# Altium footprint library ADP_Misc.PcbLib: 46 footprints (part 1 of 3)
Each footprint in its own frame and in the unit in brackets; x right, y up, seen from the top. Pads: shape width x height; smd on the part's side, far side on the other; paste and mask are expansions set on the pad; w line width, h text height; cw(c..) or ccw(c..) is an arc to the next point about the centre after c.
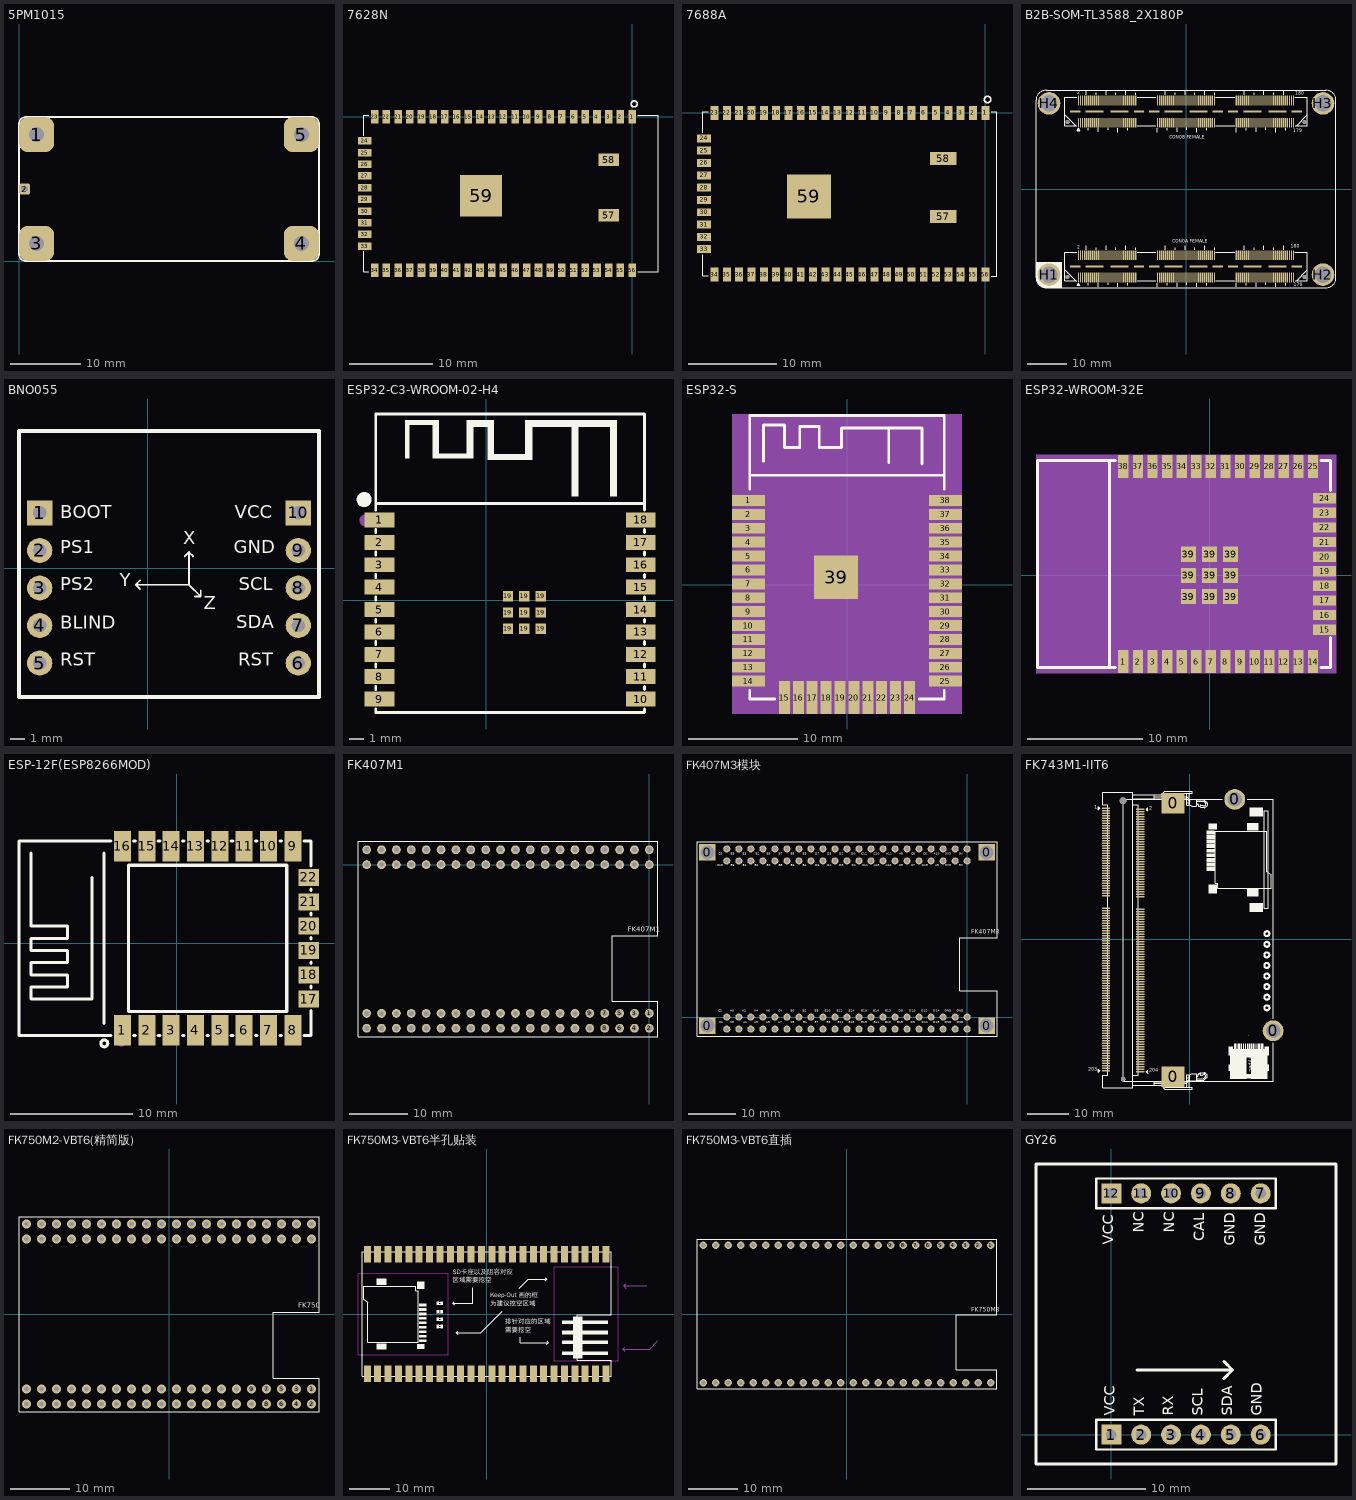
[diagram p0: the footprints below, top view; thin cyan lines are the x and y axes]

## 5PM1015 [mm] "5A输出电源模块"
pads (5):
  rrect50% 5x5 hole 2.1: 1(2.5,18) 3(2.5,2.5) 4(40.2,2.5) 5(40.2,18)
  rrect50% 1.6x1.6 hole 1: 2(0.8,10.25)
Top Overlay:
  lines w0.254: 0,1 ccw(c1,1) 1,0 41.7,0 ccw(c41.7,1) 42.7,1 42.7,19.5 ccw(c41.7,19.5) 41.7,20.5 1,20.5 ccw(c1,19.5) 0,19.5 0,1

## 7628N [mm]
height 2.5
pads (59):
  rect 0.9x1.6 smd: 1(0,0) 2(-1.4,0) 3(-2.8,0) 4(-4.2,0) 5(-5.6,0) 6(-7,0) 7(-8.4,0) 8(-9.8,0) 9(-11.2,0) 10(-12.6,0) 11(-14,0) 12(-15.4,0) 13(-16.8,0) 14(-18.2,0) 15(-19.6,0) 16(-21,0) 17(-22.4,0) 18(-23.8,0) 19(-25.2,0) 20(-26.6,0) 21(-28,0) 22(-29.4,0) 23(-30.8,0) 34(-30.8,-18.4) 35(-29.4,-18.4) 36(-28,-18.4) 37(-26.6,-18.4) 38(-25.2,-18.4) 39(-23.8,-18.4) 40(-22.4,-18.4) 41(-21,-18.4) 42(-19.6,-18.4) 43(-18.2,-18.4) 44(-16.8,-18.4) 45(-15.4,-18.4) 46(-14,-18.4) 47(-12.6,-18.4) 48(-11.2,-18.4) 49(-9.8,-18.4) 50(-8.4,-18.4) 51(-7,-18.4) 52(-5.6,-18.4) 53(-4.2,-18.4) 54(-2.8,-18.4) 55(-1.4,-18.4) 56(0,-18.4)
  rect 1.6x0.9 smd: 24(-32,-2.9) 25(-32,-4.3) 26(-32,-5.7) 27(-32,-7.1) 28(-32,-8.5) 29(-32,-9.9) 30(-32,-11.3) 31(-32,-12.7) 32(-32,-14.1) 33(-32,-15.5)
  rect 2.5x1.5 smd: 57(-2.8,-11.773) 58(-2.8,-5.173)
  rect 5x5 smd: 59(-18.066,-9.473)
Top Layer:
  lines w0.15: -30.8,-18.4 -30.8,-18.4
Top Overlay:
  circle w0.15: c0.254,1.524 r0.359
  lines w0.1: -32.131,-16.129 -32.131,-18.542 -31.496,-18.542 ; -32.131,-2.271 -32.131,0.142 -31.496,0.142 ; 0.696,-18.557 3.1,-18.557 3.1,0.142 0.696,0.142

## 7688A [mm]
height 2.5
pads (59):
  rect 0.9x1.6 smd: 1(0,0) 2(-1.4,0) 3(-2.8,0) 4(-4.2,0) 5(-5.6,0) 6(-7,0) 7(-8.4,0) 8(-9.8,0) 9(-11.2,0) 10(-12.6,0) 11(-14,0) 12(-15.4,0) 13(-16.8,0) 14(-18.2,0) 15(-19.6,0) 16(-21,0) 17(-22.4,0) 18(-23.8,0) 19(-25.2,0) 20(-26.6,0) 21(-28,0) 22(-29.4,0) 23(-30.8,0) 34(-30.8,-18.4) 35(-29.4,-18.4) 36(-28,-18.4) 37(-26.6,-18.4) 38(-25.2,-18.4) 39(-23.8,-18.4) 40(-22.4,-18.4) 41(-21,-18.4) 42(-19.6,-18.4) 43(-18.2,-18.4) 44(-16.8,-18.4) 45(-15.4,-18.4) 46(-14,-18.4) 47(-12.6,-18.4) 48(-11.2,-18.4) 49(-9.8,-18.4) 50(-8.4,-18.4) 51(-7,-18.4) 52(-5.6,-18.4) 53(-4.2,-18.4) 54(-2.8,-18.4) 55(-1.4,-18.4) 56(0,-18.4)
  rect 1.6x0.9 smd: 24(-32,-2.9) 25(-32,-4.3) 26(-32,-5.7) 27(-32,-7.1) 28(-32,-8.5) 29(-32,-9.9) 30(-32,-11.3) 31(-32,-12.7) 32(-32,-14.1) 33(-32,-15.5)
  rect 3x1.5 smd: 57(-4.8,-11.8) 58(-4.8,-5.2)
  rect 5x5 smd: 59(-20.066,-9.5)
Top Overlay:
  circle w0.15: c0.254,1.524 r0.359
  lines w0.1: -32.131,-16.129 -32.131,-18.542 -31.496,-18.542 ; -32.131,-2.271 -32.131,0.142 -31.496,0.142 ; 0.696,-18.557 1.331,-18.557 1.331,0.142 0.696,0.142

## B2B-SOM-TL3588_2X180P [mil] "B2B-SOM-TL3588_2X180P"
pads (392):
  rect 12x95 smd: A1(-1073.82,-881.76) A2(-1073.82,-661.29) A3(-1054.13,-881.76) A4(-1054.13,-661.29) A5(-1034.45,-881.76) A6(-1034.45,-661.29) A7(-1014.76,-881.76) A8(-1014.76,-661.29) A9(-995.08,-881.76) A10(-995.08,-661.29) A11(-975.4,-881.76) A12(-975.4,-661.29) A13(-955.71,-881.76) A14(-955.71,-661.29) A15(-936.03,-881.76) A16(-936.03,-661.29) A17(-916.34,-881.76) A18(-916.34,-661.29) A19(-896.66,-881.76) A20(-896.66,-661.29) A21(-876.97,-881.76) A22(-876.97,-661.29) A23(-857.29,-881.76) A24(-857.29,-661.29) A25(-837.6,-881.76) A26(-837.6,-661.29) A27(-817.92,-881.76) A28(-817.92,-661.29) A29(-798.23,-881.76) A30(-798.23,-661.29) A31(-778.55,-881.76) A32(-778.55,-661.29) A33(-758.86,-881.76) A34(-758.86,-661.29) A35(-739.18,-881.76) A36(-739.18,-661.29) A37(-719.49,-881.76) A38(-719.49,-661.29) A39(-699.81,-881.76) A40(-699.81,-661.29) A41(-680.12,-881.76) A42(-680.12,-661.29) A43(-660.44,-881.76) A44(-660.44,-661.29) A45(-640.75,-881.76) A46(-640.75,-661.29) A47(-621.07,-881.76) A48(-621.07,-661.29) A49(-601.38,-881.76) A50(-601.38,-661.29) A51(-581.7,-881.76) A52(-581.7,-661.29) A53(-562,-881.76) A54(-562,-661.29) A55(-542.33,-881.76) A56(-542.33,-661.29) A57(-522.63,-881.76) A58(-522.63,-661.29) A59(-502.96,-881.76) A60(-502.96,-661.29) A61(-286.42,-881.76) A62(-286.42,-661.29) A63(-266.74,-881.76) A64(-266.74,-661.29) A65(-247.05,-881.76) A66(-247.05,-661.29) A67(-227.37,-881.76) A68(-227.37,-661.29) A69(-207.68,-881.76) A70(-207.68,-661.29) A71(-188,-881.76) A72(-188,-661.29) A73(-168.31,-881.76) A74(-168.31,-661.29) A75(-148.63,-881.76) A76(-148.63,-661.29) A77(-128.94,-881.76) A78(-128.94,-661.29) A79(-109.26,-881.76) A80(-109.26,-661.29) A81(-89.57,-881.76) A82(-89.57,-661.29) A83(-69.89,-881.76) A84(-69.89,-661.29) A85(-50.2,-881.76) A86(-50.2,-661.29) A87(-30.52,-881.76) A88(-30.52,-661.29) A89(-10.83,-881.76) A90(-10.83,-661.29) A91(8.85,-881.76) A92(8.85,-661.29) A93(28.54,-881.76) A94(28.54,-661.29) A95(48.22,-881.76) A96(48.22,-661.29) A97(67.91,-881.76) A98(67.91,-661.29) A99(87.59,-881.76) A100(87.59,-661.29) A101(107.28,-881.76) A102(107.28,-661.29) A103(126.96,-881.76) A104(126.96,-661.29) A105(146.65,-881.76) A106(146.65,-661.29) A107(166.33,-881.76) A108(166.33,-661.29) A109(186.02,-881.76) A110(186.02,-661.29) A111(205.7,-881.76) A112(205.7,-661.29) A113(225.39,-881.76) A114(225.39,-661.29) A115(245.07,-881.76) A116(245.07,-661.29) A117(264.76,-881.76) A118(264.76,-661.29) A119(284.44,-881.76) A120(284.44,-661.29) A121(500.98,-881.76) A122(500.98,-661.29) A123(520.67,-881.76) A124(520.67,-661.29) A125(540.35,-881.76) A126(540.35,-661.29) A127(560.04,-881.76) A128(560.04,-661.29) A129(579.72,-881.76) A130(579.72,-661.29) A131(599.41,-881.76) A132(599.41,-661.29) A133(619.09,-881.76) A134(619.09,-661.29) A135(638.78,-881.76) A136(638.78,-661.29) A137(658.46,-881.76) A138(658.46,-661.29) A139(678.15,-881.76) A140(678.15,-661.29) A141(697.83,-881.76) A142(697.83,-661.29) A143(717.52,-881.76) A144(717.52,-661.29) A145(737.2,-881.76) A146(737.2,-661.29) A147(756.89,-881.76) A148(756.89,-661.29) A149(776.57,-881.76) A150(776.57,-661.29) A151(796.26,-881.76) A152(796.26,-661.29) A153(815.94,-881.76) A154(815.94,-661.29) A155(835.63,-881.76) A156(835.63,-661.29) A157(855.31,-881.76) A158(855.31,-661.29) A159(875,-881.76) A160(875,-661.29) A161(894.68,-881.76) A162(894.68,-661.29) A163(914.37,-881.76) A164(914.37,-661.29) A165(934.05,-881.76) A166(934.05,-661.29) A167(953.74,-881.76) A168(953.74,-661.29) A169(973.42,-881.76) A170(973.42,-661.29) A171(993.11,-881.76) A172(993.11,-661.29) A173(1012.79,-881.76) A174(1012.79,-661.29) A175(1032.48,-881.76) A176(1032.48,-661.29) A177(1052.16,-881.76) A178(1052.16,-661.29) A179(1071.85,-881.76) A180(1071.85,-661.29) B1(-1073.82,663.26) B2(-1073.82,883.73) B3(-1054.13,663.26) B4(-1054.13,883.73) B5(-1034.45,663.26) B6(-1034.45,883.73) B7(-1014.76,663.26) B8(-1014.76,883.73) B9(-995.08,663.26) B10(-995.08,883.73) B11(-975.4,663.26) B12(-975.4,883.73) B13(-955.71,663.26) B14(-955.71,883.73) B15(-936.03,663.26) B16(-936.03,883.73) B17(-916.34,663.26) B18(-916.34,883.73) B19(-896.66,663.26) B20(-896.66,883.73) B21(-876.97,663.26) B22(-876.97,883.73) B23(-857.29,663.26) B24(-857.29,883.73) B25(-837.6,663.26) B26(-837.6,883.73) B27(-817.92,663.26) B28(-817.92,883.73) B29(-798.23,663.26) B30(-798.23,883.73) B31(-778.55,663.26) B32(-778.55,883.73) B33(-758.86,663.26) B34(-758.86,883.73) B35(-739.18,663.26) B36(-739.18,883.73) B37(-719.49,663.26) B38(-719.49,883.73) B39(-699.81,663.26) B40(-699.81,883.73) B41(-680.12,663.26) B42(-680.12,883.73) B43(-660.44,663.26) B44(-660.44,883.73) B45(-640.75,663.26) B46(-640.75,883.73) B47(-621.07,663.26) B48(-621.07,883.73) B49(-601.38,663.26) B50(-601.38,883.73) B51(-581.7,663.26) B52(-581.7,883.73) B53(-562,663.26) B54(-562,883.73) B55(-542.33,663.26) B56(-542.33,883.73) B57(-522.63,663.26) B58(-522.63,883.73) B59(-502.96,663.26) B60(-502.96,883.73) B61(-286.42,663.26) B62(-286.42,883.73) B63(-266.74,663.26) B64(-266.74,883.73) B65(-247.05,663.26) B66(-247.05,883.73) B67(-227.37,663.26) B68(-227.37,883.73) B69(-207.68,663.26) B70(-207.68,883.73) B71(-188,663.26) B72(-188,883.73) B73(-168.31,663.26) B74(-168.31,883.73) B75(-148.63,663.26) B76(-148.63,883.73) B77(-128.94,663.26) B78(-128.94,883.73) B79(-109.26,663.26) B80(-109.26,883.73) B81(-89.57,663.26) B82(-89.57,883.73) B83(-69.89,663.26) B84(-69.89,883.73) B85(-50.2,663.26) B86(-50.2,883.73) B87(-30.52,663.26) B88(-30.52,883.73) B89(-10.83,663.26) B90(-10.83,883.73) B91(8.85,663.26) B92(8.85,883.73) B93(28.54,663.26) B94(28.54,883.73) B95(48.22,663.26) B96(48.22,883.73) B97(67.91,663.26) B98(67.91,883.73) B99(87.59,663.26) B100(87.59,883.73) B101(107.28,663.26) B102(107.28,883.73) B103(126.96,663.26) B104(126.96,883.73) B105(146.65,663.26) B106(146.65,883.73) B107(166.33,663.26) B108(166.33,883.73) B109(186.02,663.26) B110(186.02,883.73) B111(205.7,663.26) B112(205.7,883.73) B113(225.39,663.26) B114(225.39,883.73) B115(245.07,663.26) B116(245.07,883.73) B117(264.76,663.26) B118(264.76,883.73) B119(284.44,663.26) B120(284.44,883.73) B121(500.98,663.26) B122(500.98,883.73) B123(520.67,663.26) B124(520.67,883.73) B125(540.35,663.26) B126(540.35,883.73) B127(560.04,663.26) B128(560.04,883.73) B129(579.72,663.26) B130(579.72,883.73) B131(599.41,663.26) B132(599.41,883.73) B133(619.09,663.26) B134(619.09,883.73) B135(638.78,663.26) B136(638.78,883.73) B137(658.46,663.26) B138(658.46,883.73) B139(678.15,663.26) B140(678.15,883.73) B141(697.83,663.26) B142(697.83,883.73) B143(717.52,663.26) B144(717.52,883.73) B145(737.2,663.26) B146(737.2,883.73) B147(756.89,663.26) B148(756.89,883.73) B149(776.57,663.26) B150(776.57,883.73) B151(796.26,663.26) B152(796.26,883.73) B153(815.94,663.26) B154(815.94,883.73) B155(835.63,663.26) B156(835.63,883.73) B157(855.31,663.26) B158(855.31,883.73) B159(875,663.26) B160(875,883.73) B161(894.68,663.26) B162(894.68,883.73) B163(914.37,663.26) B164(914.37,883.73) B165(934.05,663.26) B166(934.05,883.73) B167(953.74,663.26) B168(953.74,883.73) B169(973.42,663.26) B170(973.42,883.73) B171(993.11,663.26) B172(993.11,883.73) B173(1012.79,663.26) B174(1012.79,883.73) B175(1032.48,663.26) B176(1032.48,883.73) B177(1052.16,663.26) B178(1052.16,883.73) B179(1071.85,663.26) B180(1071.85,883.73)
  rect 102x20 smd: A181(-1105.91,-771.53) A184(-470.87,-771.53) A185(-318.5,-771.53) A188(316.54,-771.53) A189(468.89,-771.53) A192(1103.93,-771.53) B181(-1105.91,773.5) B184(-470.87,773.5) B185(-318.5,773.5) B188(316.54,773.5) B189(468.89,773.5) B192(1103.93,773.5)
  rect 177x20 smd: A182(-913.39,-771.53) A183(-663.39,-771.53) A186(-125.98,-771.53) A187(124.02,-771.53) A190(661.41,-771.53) A191(911.41,-771.53) B182(-913.39,773.5) B183(-663.39,773.5) B186(-125.98,773.5) B187(124.02,773.5) B190(661.41,773.5) B191(911.41,773.5)
  round 225.2 / inner round 185 / far side round 225.2 hole 166: H1(-1367.13,-853.38) H2(1365.16,-853.38) H3(1365.16,855.28) H4(-1367.13,855.28)
  round 40 hole 40 unplated: ""(-1184.65,-876.64) ""(-1184.65,668.37) ""(1182.67,-876.64) ""(1182.67,668.37)
Top Overlay:
  drawing of 120 lines, arcs and shapes, not listed
  text "180" at 1045.56,-587.29 h31
  text "179" at 1075.56,-969.29 h31
  text "CON0A FEMALE" at -140.44,-536.29 h31
  text "2" at -1083.44,-593.29 h31
  text "180" at 1088.56,938.71 h31
  text "179" at 1066.56,564.71 h31
  text "CON0B FEMALE" at -168.44,501.71 h31
  text "2" at -1087.44,946.71 h31
Top Paste:
  drawing of 16 lines, arcs and shapes, not listed

## BNO055 [mm] "DFROBOT-BNO055模块"
pads (10):
  rect 1.7x1.7 hole 0.9: 1(-7.3,3.76) 10(10.2,3.76)
  round 1.7 hole 0.9: 2(-7.3,1.22) 3(-7.3,-1.32) 4(-7.3,-3.86) 5(-7.3,-6.4) 6(10.2,-6.4) 7(10.2,-3.86) 8(10.2,-1.32) 9(10.2,1.22)
Top Overlay:
  lines w0.127: -0.517,-1.383 -0.8,-1.1 ; -0.517,-0.817 -0.8,-1.1 ; 2.517,0.817 2.8,1.1 ; 3.083,0.817 2.8,1.1 ; 3.2,-1.9 3.6,-1.9 ; 3.6,-1.5 3.6,-1.9 ; -0.8,-1.1 2.8,-1.1 ; 2.8,-1.1 2.8,1.1 ; 2.8,-1.1 3.6,-1.9 ; 3.6,-1.9 3.6,-1.9
  lines w0.254: -8.7,-8.7 -8.7,9.3 11.6,9.3 11.6,-8.7 -8.7,-8.7
  text "PS1" at -5.9,0.716 h1.52
  text "RST" at -5.9,-6.884 h1.52
  text "PS2" at -5.9,-1.767 h1.52
  text "BLIND" at -5.9,-4.383 h1.52
  text "BOOT" at -5.9,3.076 h1.52
  text "GND" at 5.843,0.716 h1.52
  text "SCL" at 6.185,-1.767 h1.52
  text "RST" at 6.136,-6.884 h1.52
  text "VCC" at 5.908,3.076 h1.52
  text "SDA" at 5.985,-4.367 h1.52
  text "Y" at -1.899,-1.5 h1.52
  text "X" at 2.399,1.317 h1.52
  text "Z" at 3.799,-3.083 h1.52
3D body "HDR2.54-1P_M.STEP": height 8.5, standoff -3, extent -8.57,-7.67 -6.03,-5.13
3D body "HDR2.54-1P_M.STEP": height 8.5, standoff -3, extent -8.57,-5.13 -6.03,-2.59
3D body "HDR2.54-1P_M.STEP": height 8.5, standoff -3, extent -8.57,-0.05 -6.03,2.49
3D body "HDR2.54-1P_M.STEP": height 8.5, standoff -3, extent -8.57,2.49 -6.03,5.03
3D body "HDR2.54-1P_M.STEP": height 8.5, standoff -3, extent -8.57,-2.59 -6.03,-0.05
3D body "HDR2.54-1P_M.STEP": height 8.5, standoff -3, extent 8.93,-7.67 11.47,-5.13
3D body "HDR2.54-1P_M.STEP": height 8.5, standoff -3, extent 8.93,-5.13 11.47,-2.59
3D body "HDR2.54-1P_M.STEP": height 8.5, standoff -3, extent 8.93,-0.05 11.47,2.49
3D body "HDR2.54-1P_M.STEP": height 8.5, standoff -3, extent 8.93,2.49 11.47,5.03
3D body "HDR2.54-1P_M.STEP": height 8.5, standoff -3, extent 8.93,-2.59 11.47,-0.05

## ESP32-C3-WROOM-02-H4 [mm]
pads (27):
  rect 2x1 smd: 1(-7.149,5.38) 2(-7.149,3.88) 3(-7.149,2.38) 4(-7.149,0.88) 5(-7.149,-0.62) 6(-7.149,-2.12) 7(-7.149,-3.62) 8(-7.149,-5.12) 9(-7.149,-6.62) 10(10.351,-6.62) 11(10.351,-5.12) 12(10.351,-3.62) 13(10.351,-2.12) 14(10.351,-0.62) 15(10.351,0.88) 16(10.351,2.38) 17(10.351,3.88) 18(10.351,5.38)
  rect 0.7x0.7 smd: 19(1.461,-1.92) 19(1.461,-0.82) 19(1.461,0.28) 19(2.561,-1.92) 19(2.561,-0.82) 19(2.561,0.28) 19(3.661,-1.92) 19(3.661,-0.82) 19(3.661,0.28)
Top Overlay:
  circle w0.5: c-8.178,6.746 r0.25
  region: -4.969,12.065 -3.191,12.065 -3.191,9.815 -1.286,9.815 -1.286,12.065 0.492,12.065 0.492,9.797 2.632,9.797 2.632,12.047 8.747,12.047 8.747,6.985 8.311,6.985 8.311,11.612 6.17,11.612 6.17,6.967 5.717,6.967 5.717,11.612 3.086,11.612 3.086,9.398 0.092,9.398 0.092,11.63 -0.851,11.63 -0.851,9.507 -3.591,9.507 -3.591,11.775 -5.151,11.775 -5.151,9.507 -5.423,9.507 -5.423,12.047
  lines w0.2: -7.399,-7.274 -7.399,-7.52 10.601,-7.52 10.601,-7.274 ; -7.399,-5.966 -7.399,-5.774 ; -7.399,-4.466 -7.399,-4.274 ; -7.399,-2.966 -7.399,-2.774 ; -7.399,-1.466 -7.399,-1.274 ; -7.399,0.034 -7.399,0.226 ; -7.399,1.534 -7.399,1.726 ; -7.399,3.034 -7.399,3.226 ; -7.399,4.534 -7.399,4.726 ; -7.399,6.034 -7.399,12.48 10.601,12.48 10.601,6.034 ; -7.399,6.48 10.601,6.48 ; 10.601,-5.966 10.601,-5.774 ; 10.601,-4.466 10.601,-4.274 ; 10.601,-2.966 10.601,-2.774 ; 10.601,-1.466 10.601,-1.274 ; 10.601,0.034 10.601,0.226 ; 10.601,1.534 10.601,1.726 ; 10.601,3.034 10.601,3.226 ; 10.601,4.534 10.601,4.726
Mechanical 15:
  circle w0.4: c-8.097,5.351 r0.2

## ESP32-S [mm]
pads (39):
  rect 3x1 smd: 1(-9.041,7.699) 2(-9.041,6.429) 3(-9.041,5.159) 4(-9.041,3.889) 5(-9.041,2.619) 6(-9.041,1.349) 7(-9.041,0.079) 8(-9.041,-1.191) 9(-9.041,-2.461) 10(-9.041,-3.731) 11(-9.041,-5.001) 12(-9.041,-6.271) 13(-9.041,-7.541) 14(-9.041,-8.811) 25(8.959,-8.811) 26(8.959,-7.541) 27(8.959,-6.271) 28(8.959,-5.001) 29(8.959,-3.731) 30(8.959,-2.461) 31(8.959,-1.191) 32(8.959,0.079) 33(8.959,1.349) 34(8.959,2.619) 35(8.959,3.889) 36(8.959,5.159) 37(8.959,6.429) 38(8.959,7.699)
  rect 1x3 smd: 15(-5.756,-10.311) 16(-4.486,-10.311) 17(-3.216,-10.311) 18(-1.946,-10.311) 19(-0.676,-10.311) 20(0.594,-10.311) 21(1.864,-10.311) 22(3.134,-10.311) 23(4.404,-10.311) 24(5.674,-10.311)
  rect 4x4 smd: 39(-1.041,0.689)
Top Overlay:
  lines w0.254: -8.931,-9.676 -8.931,-10.438 -6.645,-10.438 ; -8.931,8.739 -8.931,15.47 8.849,15.47 8.849,8.739 ; -8.931,10.009 8.849,10.009 ; -7.661,11.278 -7.661,14.58 -5.756,14.58 -5.756,12.548 -4.359,12.548 -4.359,14.453 -2.581,14.453 -2.581,12.548 -0.549,12.548 -0.549,14.326 6.817,14.326 6.817,11.024 ; 3.769,11.152 3.769,14.327 ; 6.563,-10.438 8.849,-10.438 8.849,-9.676
Mechanical 4:
  region: -10.541,15.597 10.465,15.597 10.465,-11.811 -10.541,-11.811
Mechanical 5:
  drawing of 39 lines, arcs and shapes, not listed

## ESP32-WROOM-32E [mm]
pads (47):
  rect 0.9x2 smd: 1(-7.512,-7.5) 2(-6.242,-7.5) 3(-4.972,-7.5) 4(-3.702,-7.5) 5(-2.432,-7.5) 6(-1.162,-7.5) 7(0.108,-7.5) 8(1.378,-7.5) 9(2.648,-7.5) 10(3.918,-7.5) 11(5.188,-7.5) 12(6.458,-7.5) 13(7.728,-7.5) 14(8.998,-7.5) 25(8.998,9.5) 26(7.728,9.5) 27(6.458,9.5) 28(5.188,9.5) 29(3.918,9.5) 30(2.648,9.5) 31(1.378,9.5) 32(0.108,9.5) 33(-1.162,9.5) 34(-2.432,9.5) 35(-3.702,9.5) 36(-4.972,9.5) 37(-6.242,9.5) 38(-7.512,9.5)
  rect 2x0.9 smd: 15(9.998,-4.715) 16(9.998,-3.445) 17(9.998,-2.175) 18(9.998,-0.905) 19(9.998,0.365) 20(9.998,1.635) 21(9.998,2.905) 22(9.998,4.175) 23(9.998,5.445) 24(9.998,6.715)
  rect 1.33x1.33 smd: 39(-1.847,-1.835) 39(-1.847,0) 39(-1.847,1.835) 39(-0.012,-1.835) 39(-0.012,0) 39(-0.012,1.835) 39(1.823,-1.835) 39(1.823,0) 39(1.823,1.835)
Top Overlay:
  lines w0.254: -8.702,10 -8.702,-8 -8.193,-8 ; -8.702,10.017 -8.193,10.017 ; -8.536,-8 -14.986,-8 -14.986,10 -8.52,10 ; 9.679,-8 10.514,-8 10.514,-5.396 ; 9.679,10.017 10.514,10.017 10.514,7.396
Mechanical 4:
  region: -15.113,-8.509 -15.113,10.5 10.998,10.5 10.998,-8.509
Mechanical 5:
  drawing of 47 lines, arcs and shapes, not listed
Mechanical 15:
  lines w0.003: -2.083,1.45 -2.032,1.501

## ESP-12F(ESP8266MOD) [mm]
pads (22):
  rect 1.4x2.5 smd: 1(-4.454,-7.141) 2(-2.454,-7.141) 3(-0.454,-7.141) 4(1.546,-7.141) 5(3.546,-7.141) 6(5.546,-7.141) 7(7.546,-7.141) 8(9.546,-7.14) 9(9.546,7.96) 10(7.546,7.961) 11(5.546,7.962) 12(3.546,7.962) 13(1.546,7.961) 14(-0.454,7.962) 15(-2.454,7.961) 16(-4.454,7.962)
  rect 1.7x1.4 smd: 17(10.847,-4.589) 18(10.846,-2.591) 19(10.846,-0.592) 20(10.846,1.409) 21(10.846,3.408) 22(10.847,5.408)
Top Overlay:
  circle w0.254: c-5.947,-8.225 r0.284
  lines w0.254: -12.954,-7.591 -12.954,8.409 -5.385,8.409 ; -12.954,-7.59 -5.385,-7.59 ; -11.954,7.409 -11.954,1.409 -8.954,1.409 -8.954,0.409 -11.954,0.409 -11.954,-0.591 -8.954,-0.591 -8.954,-1.591 -11.954,-1.591 -11.954,-2.591 -8.954,-2.591 -8.954,-3.591 -11.954,-3.591 -11.954,-4.591 -6.954,-4.591 -6.954,5.409 ; -5.954,-6.591 -5.954,7.409 ; -3.523,-7.59 -3.385,-7.59 ; -3.523,8.409 -3.385,8.409 ; -1.523,-7.59 -1.385,-7.59 ; -1.523,8.409 -1.385,8.409 ; 0.477,-7.59 0.615,-7.59 ; 0.477,8.409 0.615,8.409 ; 2.477,-7.59 2.615,-7.59 ; 2.477,8.409 2.615,8.409 ; 4.477,-7.59 4.615,-7.59 ; 4.477,8.409 4.615,8.409 ; 6.477,-7.59 6.615,-7.59 ; 6.477,8.409 6.615,8.409 ; 8.477,-7.59 8.615,-7.59 ; 8.477,8.409 8.615,8.409 ; 10.477,-7.59 11.044,-7.59 11.044,-5.52 ; 10.477,8.409 11.044,8.409 11.044,6.339 ; 11.044,-3.658 11.044,-3.522 ; 11.044,-1.66 11.044,-1.523 ; 11.044,0.339 11.044,0.477 ; 11.044,2.34 11.044,2.477 ; 11.044,4.339 11.044,4.477 ; -3.954,-5.591 9.046,-5.591 9.046,6.409 -3.954,6.409 -3.954,-5.591
Mechanical 15:
  circle w0.5: c-4.55,-7.971 r0.25

## FK407M1 [mm]
pads (80):
  round 1.5 hole 0.9: 1(0,-25.4) 2(0,-27.94) 3(-2.54,-25.4) 4(-2.54,-27.94) 5(-5.08,-25.4) 6(-5.08,-27.94) 7(-7.62,-25.4) 8(-7.62,-27.94) 9(-10.16,-25.4) 10(-10.16,-27.94) 11(-12.7,-25.4) 12(-12.7,-27.94) 13(-15.24,-25.4) 14(-15.24,-27.94) 15(-17.78,-25.4) 16(-17.78,-27.94) 17(-20.32,-25.4) 18(-20.32,-27.94) 19(-22.86,-25.4) 20(-22.86,-27.94) 21(-25.4,-25.4) 22(-25.4,-27.94) 23(-27.94,-25.4) 24(-27.94,-27.94) 25(-30.48,-25.4) 26(-30.48,-27.94) 27(-33.02,-25.4) 28(-33.02,-27.94) 29(-35.56,-25.4) 30(-35.56,-27.94) 31(-38.1,-25.4) 32(-38.1,-27.94) 33(-40.64,-25.4) 34(-40.64,-27.94) 35(-43.18,-25.4) 36(-43.18,-27.94) 37(-45.72,-25.4) 38(-45.72,-27.94) 39(-48.26,-25.4) 40(-48.26,-27.94) 41(0,2.54) 42(0,0) 43(-2.54,2.54) 44(-2.54,0) 45(-5.08,2.54) 46(-5.08,0) 47(-7.62,2.54) 48(-7.62,0) 49(-10.16,2.54) 50(-10.16,0) 51(-12.7,2.54) 52(-12.7,0) 53(-15.24,2.54) 54(-15.24,0) 55(-17.78,2.54) 56(-17.78,0) 57(-20.32,2.54) 58(-20.32,0) 59(-22.86,2.54) 60(-22.86,0) 61(-25.4,2.54) 62(-25.4,0) 63(-27.94,2.54) 64(-27.94,0) 65(-30.48,2.54) 66(-30.48,0) 67(-33.02,2.54) 68(-33.02,0) 69(-35.56,2.54) 70(-35.56,0) 71(-38.1,2.54) 72(-38.1,0) 73(-40.64,2.54) 74(-40.64,0) 75(-43.18,2.54) 76(-43.18,0) 77(-45.72,2.54) 78(-45.72,0) 79(-48.26,2.54) 80(-48.26,0)
Top Overlay:
  lines w0.203: -49.733,-29.413 -49.733,4.013 1.473,4.013 1.473,-12.182 -6.321,-12.182 -6.321,-23.358 1.473,-23.358 1.473,-29.413 -49.733,-29.413
  text "FK407M1" at -3.7,-11.8 h1.52

## FK407M3模块 [mm]
pads (88):
  rect 3.5x3.5 hole 3: 0(-54.887,-1.8) 0(-54.887,34.82) 0(4.093,-1.8) 0(4.093,34.82)
  round 1.5 hole 0.9: 1(0,35.56) 2(0,33.02) 3(-2.54,35.56) 4(-2.54,33.02) 5(-5.08,35.56) 6(-5.08,33.02) 7(-7.62,35.56) 8(-7.62,33.02) 9(-10.16,35.56) 10(-10.16,33.02) 11(-12.7,35.56) 12(-12.7,33.02) 13(-15.24,35.56) 14(-15.24,33.02) 15(-17.78,35.56) 16(-17.78,33.02) 17(-20.32,35.56) 18(-20.32,33.02) 19(-22.86,35.56) 20(-22.86,33.02) 21(-25.4,35.56) 22(-25.4,33.02) 23(-27.94,35.56) 24(-27.94,33.02) 25(-30.48,35.56) 26(-30.48,33.02) 27(-33.02,35.56) 28(-33.02,33.02) 29(-35.56,35.56) 30(-35.56,33.02) 31(-38.1,35.56) 32(-38.1,33.02) 33(-40.64,35.56) 34(-40.64,33.02) 35(-43.18,35.56) 36(-43.18,33.02) 37(-45.72,35.56) 38(-45.72,33.02) 39(-48.26,35.56) 40(-48.26,33.02) 41(-50.8,35.56) 42(-50.8,33.02) 43(0,0) 44(0,-2.54) 45(-2.54,0) 46(-2.54,-2.54) 47(-5.08,0) 48(-5.08,-2.54) 49(-7.62,0) 50(-7.62,-2.54) 51(-10.16,0) 52(-10.16,-2.54) 53(-12.7,0) 54(-12.7,-2.54) 55(-15.24,0) 56(-15.24,-2.54) 57(-17.78,0) 58(-17.78,-2.54) 59(-20.32,0) 60(-20.32,-2.54) 61(-22.86,0) 62(-22.86,-2.54) 63(-25.4,0) 64(-25.4,-2.54) 65(-27.94,0) 66(-27.94,-2.54) 67(-30.48,0) 68(-30.48,-2.54) 69(-33.02,0) 70(-33.02,-2.54) 71(-35.56,0) 72(-35.56,-2.54) 73(-38.1,0) 74(-38.1,-2.54) 75(-40.64,0) 76(-40.64,-2.54) 77(-43.18,0) 78(-43.18,-2.54) 79(-45.72,0) 80(-45.72,-2.54) 81(-48.26,0) 82(-48.26,-2.54) 83(-50.8,0) 84(-50.8,-2.54)
Top Overlay:
  lines w0.254: -57.097,-4.01 6.303,-4.01 6.303,5.593 -1.591,5.593 -1.591,16.793 6.303,16.793 6.303,37.03 -57.097,37.03 -57.097,-4.01
  text "FK407M3" at 0.9,17.3 h1.52
  text "GND" at -2.183,-1.534 h0.81
  text "GND" at -4.723,-1.534 h0.81
  text "D13" at -7.196,-1.534 h0.81
  text "D11" at -9.6,-1.534 h0.81
  text "D9" at -11.937,-1.534 h0.81
  text "B15" at -14.816,-1.534 h0.81
  text "B12" at -17.356,-1.534 h0.81
  text "B11" at -19.76,-1.534 h0.81
  text "E15" at -22.436,-1.534 h0.81
  text "E13" at -24.976,-1.534 h0.81
  text "E11" at -27.38,-1.534 h0.81
  text "E9" at -29.717,-1.534 h0.81
  text "E7" at -32.257,-1.534 h0.81
  text "B1" at -34.662,-1.534 h0.81
  text "C5" at -37.337,-1.534 h0.81
  text "A7" at -39.877,-1.534 h0.81
  text "A5" at -42.417,-1.534 h0.81
  text "A3" at -44.957,-1.534 h0.81
  text "A1" at -47.362,-1.534 h0.81
  text "C3" at -50.037,-1.534 h0.81
  text "C1" at -52.442,-1.534 h0.81
  text "C2" at -52.577,0.88 h0.81
  text "A0" at -50.037,0.88 h0.81
  text "A2" at -47.497,0.88 h0.81
  text "A4" at -44.957,0.88 h0.81
  text "A6" at -42.417,0.88 h0.81
  text "C4" at -39.877,0.88 h0.81
  text "B0" at -37.337,0.88 h0.81
  text "B2" at -34.797,0.88 h0.81
  text "E8" at -32.257,0.88 h0.81
  text "E10" at -30.056,0.88 h0.81
  text "E12" at -27.516,0.88 h0.81
  text "E14" at -24.976,0.88 h0.81
  text "B10" at -22.436,0.88 h0.81
  text "B14" at -19.896,0.88 h0.81
  text "B13" at -17.356,0.88 h0.81
  text "D8" at -14.477,0.88 h0.81
  text "D10" at -12.276,0.88 h0.81
  text "D12" at -9.736,0.88 h0.81
  text "D14" at -7.196,0.88 h0.81
  text "GND" at -4.723,0.88 h0.81
  text "GND" at -2.183,0.88 h0.81
  text "5V" at -1.677,31.627 h0.81
  text "3V3" at -4.623,31.627 h0.81
  text "A9" at -6.757,31.627 h0.81
  text "D15" at -9.636,31.627 h0.81
  text "C7" at -11.837,31.627 h0.81
  text "C9" at -14.377,31.627 h0.81
  text "A12" at -17.256,31.627 h0.81
  text "A15" at -19.796,31.627 h0.81
  text "C11" at -22.2,31.627 h0.81
  text "D1" at -24.402,31.627 h0.81
  text "D3" at -27.077,31.627 h0.81
  text "D4" at -29.617,31.627 h0.81
  text "D6" at -32.157,31.627 h0.81
  text "B4" at -34.697,31.627 h0.81
  text "B6" at -37.237,31.627 h0.81
  text "B8" at -39.777,31.627 h0.81
  text "E0" at -42.317,31.627 h0.81
  text "E2" at -44.857,31.627 h0.81
  text "E4" at -47.397,31.627 h0.81
  text "E6" at -49.937,31.627 h0.81
  text "C13" at -52.816,31.627 h0.81
  text "C0" at -52.477,34.056 h0.81
  text "E5" at -49.937,34.056 h0.81
  text "E3" at -47.397,34.056 h0.81
  text "E1" at -44.722,34.056 h0.81
  text "B9" at -42.317,34.056 h0.81
  text "B7" at -39.777,34.056 h0.81
  text "B5" at -37.237,34.056 h0.81
  text "B3" at -34.697,34.056 h0.81
  text "D7" at -32.157,34.056 h0.81
  text "D5" at -29.617,34.056 h0.81
  text "D2" at -27.077,34.056 h0.81
  text "D0" at -24.537,34.056 h0.81
  text "C12" at -22.336,34.056 h0.81
  text "C10" at -19.796,34.056 h0.81
  text "A11" at -17.12,34.056 h0.81
  text "A8" at -14.377,34.056 h0.81
  text "C8" at -11.837,34.056 h0.81
  text "C6" at -9.297,34.056 h0.81
  text "A10" at -7.096,34.056 h0.81
  text "3V3" at -4.623,34.056 h0.81
  text "5V" at -1.677,34.056 h0.81

## FK743M1-IIT6 [mm]
pads (210):
  round 1.1 hole 1.1 unplated: 0(-15.951,-33.569)
  round 1.6 hole 1.6 unplated: 0(-15.951,33.231)
  rect 5.5x5 smd: 0(-3.951,-32.969) 0(-3.951,32.631)
  round 5 hole 3.5: 0(10.852,33.569) 0(20.052,-21.931)
  rect 2x0.35 smd: 1(-20.052,31.481) 2(-11.851,31.181) 3(-20.052,30.881) 4(-11.851,30.581) 5(-20.052,30.281) 6(-11.851,29.981) 7(-20.052,29.681) 8(-11.851,29.381) 9(-20.052,29.081) 10(-11.851,28.781) 11(-20.052,28.481) 12(-11.851,28.181) 13(-20.052,27.881) 14(-11.851,27.581) 15(-20.052,27.281) 16(-11.851,26.981) 17(-20.052,26.681) 18(-11.851,26.381) 19(-20.052,26.081) 20(-11.851,25.781) 21(-20.052,25.481) 22(-11.851,25.181) 23(-20.052,24.881) 24(-11.851,24.581) 25(-20.052,24.281) 26(-11.851,23.981) 27(-20.052,23.681) 28(-11.851,23.381) 29(-20.052,23.081) 30(-11.851,22.781) 31(-20.052,22.481) 32(-11.851,22.181) 33(-20.052,21.881) 34(-11.851,21.581) 35(-20.052,21.281) 36(-11.851,20.981) 37(-20.052,20.681) 38(-11.851,20.381) 39(-20.052,20.081) 40(-11.851,19.781) 41(-20.052,19.481) 42(-11.851,19.181) 43(-20.052,18.881) 44(-11.851,18.581) 45(-20.052,18.281) 46(-11.851,17.981) 47(-20.052,17.681) 48(-11.851,17.381) 49(-20.052,17.081) 50(-11.851,16.781) 51(-20.052,16.481) 52(-11.851,16.181) 53(-20.052,15.881) 54(-11.851,15.581) 55(-20.052,15.281) 56(-11.851,14.981) 57(-20.052,14.681) 58(-11.851,14.381) 59(-20.052,14.081) 60(-11.851,13.781) 61(-20.052,13.481) 62(-11.851,13.181) 63(-20.052,12.881) 64(-11.851,12.581) 65(-20.052,12.281) 66(-11.851,11.981) 67(-20.052,11.681) 68(-11.851,11.381) 69(-20.052,11.081) 70(-11.851,10.781) 71(-20.052,10.481) 72(-11.851,10.181) 73(-20.052,7.481) 74(-11.851,7.181) 75(-20.052,6.881) 76(-11.851,6.581) 77(-20.052,6.281) 78(-11.851,5.981) 79(-20.052,5.681) 80(-11.851,5.381) 81(-20.052,5.081) 82(-11.851,4.781) 83(-20.052,4.481) 84(-11.851,4.181) 85(-20.052,3.881) 86(-11.851,3.581) 87(-20.052,3.281) 88(-11.851,2.981) 89(-20.052,2.681) 90(-11.851,2.381) 91(-20.052,2.081) 92(-11.851,1.781) 93(-20.052,1.481) 94(-11.851,1.181) 95(-20.052,0.881) 96(-11.851,0.581) 97(-20.052,0.281) 98(-11.851,-0.019) 99(-20.052,-0.319) 100(-11.851,-0.619) 101(-20.052,-0.919) 102(-11.851,-1.219) 103(-20.052,-1.519) 104(-11.851,-1.819) 105(-20.052,-2.119) 106(-11.851,-2.419) 107(-20.052,-2.719) 108(-11.851,-3.019) 109(-20.052,-3.319) 110(-11.851,-3.619) 111(-20.052,-3.919) 112(-11.851,-4.219) 113(-20.052,-4.519) 114(-11.851,-4.819) 115(-20.052,-5.119) 116(-11.851,-5.419) 117(-20.052,-5.719) 118(-11.851,-6.019) 119(-20.052,-6.319) 120(-11.851,-6.619) 121(-20.052,-6.919) 122(-11.851,-7.219) 123(-20.052,-7.519) 124(-11.851,-7.819) 125(-20.052,-8.119) 126(-11.851,-8.419) 127(-20.052,-8.719) 128(-11.851,-9.019) 129(-20.052,-9.319) 130(-11.851,-9.619) 131(-20.052,-9.919) 132(-11.851,-10.219) 133(-20.052,-10.519) 134(-11.851,-10.819) 135(-20.052,-11.119) 136(-11.851,-11.419) 137(-20.052,-11.719) 138(-11.851,-12.019) 139(-20.052,-12.319) 140(-11.851,-12.619) 141(-20.052,-12.919) 142(-11.851,-13.219) 143(-20.052,-13.519) 144(-11.851,-13.819) 145(-20.052,-14.119) 146(-11.851,-14.419) 147(-20.052,-14.719) 148(-11.851,-15.019) 149(-20.052,-15.319) 150(-11.851,-15.619) 151(-20.052,-15.919) 152(-11.851,-16.219) 153(-20.052,-16.519) 154(-11.851,-16.819) 155(-20.052,-17.119) 156(-11.851,-17.419) 157(-20.052,-17.719) 158(-11.851,-18.019) 159(-20.052,-18.319) 160(-11.851,-18.619) 161(-20.052,-18.919) 162(-11.851,-19.219) 163(-20.052,-19.519) 164(-11.851,-19.819) 165(-20.052,-20.119) 166(-11.851,-20.419) 167(-20.052,-20.719) 168(-11.851,-21.019) 169(-20.052,-21.319) 170(-11.851,-21.619) 171(-20.052,-21.919) 172(-11.851,-22.219) 173(-20.052,-22.519) 174(-11.851,-22.819) 175(-20.052,-23.119) 176(-11.851,-23.419) 177(-20.052,-23.719) 178(-11.851,-24.019) 179(-20.052,-24.319) 180(-11.851,-24.619) 181(-20.052,-24.919) 182(-11.851,-25.219) 183(-20.052,-25.519) 184(-11.851,-25.819) 185(-20.052,-26.119) 186(-11.851,-26.419) 187(-20.052,-26.719) 188(-11.851,-27.019) 189(-20.052,-27.319) 190(-11.851,-27.619) 191(-20.052,-27.919) 192(-11.851,-28.219) 193(-20.052,-28.519) 194(-11.851,-28.819) 195(-20.052,-29.119) 196(-11.851,-29.419) 197(-20.052,-29.719) 198(-11.851,-30.019) 199(-20.052,-30.319) 200(-11.851,-30.619) 201(-20.052,-30.919) 202(-11.851,-31.219) 203(-20.052,-31.519) 204(-11.851,-31.819)
Top Overlay:
  drawing of 259 lines, arcs and shapes, not listed
  text "TypeC" at 13.92,-28.189 h1.52
  text "1" at -22.822,31.01 h1.52
  text "2" at -9.615,30.769 h1.52
  text "203" at -24.258,-31.929 h1.52
  text "204" at -9.691,-32.183 h1.52
3D body "DDR3 SODIMM-204Pin.STEP": height 5.65, standoff -0.5, extent -20.969,-35.967 5.571,35.633
3D body "FK743M1-IIT6-V1.0.step": height 7.16, standoff 0.93, extent -15.964,-34.039 20.036,33.561

## FK750M2-VBT6(精简版) [mm]
pads (80):
  round 1.5 hole 0.9: 1(24.13,-12.7) 2(24.13,-15.24) 3(21.59,-12.7) 4(21.59,-15.24) 5(19.05,-12.7) 6(19.05,-15.24) 7(16.51,-12.7) 8(16.51,-15.24) 9(13.97,-12.7) 10(13.97,-15.24) 11(11.43,-12.7) 12(11.43,-15.24) 13(8.89,-12.7) 14(8.89,-15.24) 15(6.35,-12.7) 16(6.35,-15.24) 17(3.81,-12.7) 18(3.81,-15.24) 19(1.27,-12.7) 20(1.27,-15.24) 21(-1.27,-12.7) 22(-1.27,-15.24) 23(-3.81,-12.7) 24(-3.81,-15.24) 25(-6.35,-12.7) 26(-6.35,-15.24) 27(-8.89,-12.7) 28(-8.89,-15.24) 29(-11.43,-12.7) 30(-11.43,-15.24) 31(-13.97,-12.7) 32(-13.97,-15.24) 33(-16.51,-12.7) 34(-16.51,-15.24) 35(-19.05,-12.7) 36(-19.05,-15.24) 37(-21.59,-12.7) 38(-21.59,-15.24) 39(-24.13,-12.7) 40(-24.13,-15.24) 41(24.13,15.24) 42(24.13,12.7) 43(21.59,15.24) 44(21.59,12.7) 45(19.05,15.24) 46(19.05,12.7) 47(16.51,15.24) 48(16.51,12.7) 49(13.97,15.24) 50(13.97,12.7) 51(11.43,15.24) 52(11.43,12.7) 53(8.89,15.24) 54(8.89,12.7) 55(6.35,15.24) 56(6.35,12.7) 57(3.81,15.24) 58(3.81,12.7) 59(1.27,15.24) 60(1.27,12.7) 61(-1.27,15.24) 62(-1.27,12.7) 63(-3.81,15.24) 64(-3.81,12.7) 65(-6.35,15.24) 66(-6.35,12.7) 67(-8.89,15.24) 68(-8.89,12.7) 69(-11.43,15.24) 70(-11.43,12.7) 71(-13.97,15.24) 72(-13.97,12.7) 73(-16.51,15.24) 74(-16.51,12.7) 75(-19.05,15.24) 76(-19.05,12.7) 77(-21.59,15.24) 78(-21.59,12.7) 79(-24.13,15.24) 80(-24.13,12.7)
Top Overlay:
  rectangle: 17.6,-10.484 17.632,-0.197
  lines w0.152: -25.4,-16.51 25.4,-16.51 25.4,-10.847 17.632,-10.847 17.632,0.329 25.4,0.329 25.4,16.51 -25.4,16.51 -25.4,-16.51
  text "FK750" at 21.9,0.7 h1.52
3D body "FK750M2-VBT6-V1.0.step": height 8.36, standoff 1.86, extent -25.4,-16.51 25.4,16.51

## FK750M3-VBT6半孔贴装 [mm]
pads (48):
  rect 1.7x4 smd: 1(29.21,14.605) 2(26.67,14.605) 3(24.13,14.605) 4(21.59,14.605) 5(19.05,14.605) 6(16.51,14.605) 7(13.97,14.605) 8(11.43,14.605) 9(8.89,14.605) 10(6.35,14.605) 11(3.81,14.605) 12(1.27,14.605) 13(-1.27,14.605) 14(-3.81,14.605) 15(-6.35,14.605) 16(-8.89,14.605) 17(-11.43,14.605) 18(-13.97,14.605) 19(-16.51,14.605) 20(-19.05,14.605) 21(-21.59,14.605) 22(-24.13,14.605) 23(-26.67,14.605) 24(-29.21,14.605) 25(29.21,-14.605) 26(26.67,-14.605) 27(24.13,-14.605) 28(21.59,-14.605) 29(19.05,-14.605) 30(16.51,-14.605) 31(13.97,-14.605) 32(11.43,-14.605) 33(8.89,-14.605) 34(6.35,-14.605) 35(3.81,-14.605) 36(1.27,-14.605) 37(-1.27,-14.605) 38(-3.81,-14.605) 39(-6.35,-14.605) 40(-8.89,-14.605) 41(-11.43,-14.605) 42(-13.97,-14.605) 43(-16.51,-14.605) 44(-19.05,-14.605) 45(-21.59,-14.605) 46(-24.13,-14.605) 47(-26.67,-14.605) 48(-29.21,-14.605)
Top Overlay:
  rectangle: 21.133,-10.954 23.419,-0.667
  rectangle: 18.466,-2.445 29.769,-1.556
  rectangle: 18.466,-4.985 29.769,-4.096
  rectangle: 18.466,-7.398 29.769,-6.509
  rectangle: 18.466,-10.065 29.769,-9.176
  region: -10.668,1.003 -11.303,1.003 -11.303,0.114 -10.668,0.114
  region: -10.668,-2.616 -11.303,-2.616 -11.303,-3.505 -10.668,-3.505
  region: -10.655,-0.826 -11.29,-0.826 -11.29,-1.714 -10.655,-1.714
  region: -10.668,3.048 -11.303,3.048 -11.303,2.159 -10.668,2.159
  region: -24.46,-7.163 -26.949,-7.163 -26.949,-8.738 -24.46,-8.738
  region: -24.46,8.738 -26.949,8.738 -26.949,7.15 -24.46,7.15
  region: -11.684,1.003 -12.319,1.003 -12.319,0.114 -11.684,0.114
  region: -11.684,-2.616 -12.319,-2.616 -12.319,-3.505 -11.684,-3.505
  region: -11.671,-0.826 -12.306,-0.826 -12.306,-1.714 -11.671,-1.714
  region: -11.684,3.048 -12.319,3.048 -12.319,2.159 -11.684,2.159
  region: -15.202,-7.302 -17.005,-7.302 -17.005,-8.611 -15.202,-8.611
  region: -14.694,-5.109 -16.51,-5.109 -16.51,-5.808 -14.694,-5.808
  region: -14.694,-6.209 -16.51,-6.209 -16.51,-6.908 -14.694,-6.908
  region: -14.694,-4.009 -16.51,-4.009 -16.51,-4.708 -14.694,-4.708
  region: -14.694,-1.809 -16.51,-1.809 -16.51,-2.508 -14.694,-2.508
  region: -14.694,0.391 -16.51,0.391 -16.51,-0.308 -14.694,-0.308
  region: -14.694,2.591 -16.51,2.591 -16.51,1.892 -14.694,1.892
  region: -14.694,-0.709 -16.51,-0.709 -16.51,-1.408 -14.694,-1.408
  region: -14.694,-2.909 -16.51,-2.909 -16.51,-3.608 -14.694,-3.608
  region: -15.215,7.988 -17.005,7.988 -17.005,6.096 -15.215,6.096
  region: -14.694,1.491 -16.51,1.491 -16.51,0.792 -14.694,0.792
  lines w0.102: -11.611,-3.284 -11.383,-3.284 ; -11.611,-2.776 -11.383,-2.776 ; -11.611,0.335 -11.383,0.335 ; -11.611,0.843 -11.383,0.843 ; -11.611,2.38 -11.383,2.38 ; -11.611,2.888 -11.383,2.888 ; -11.598,-1.494 -11.37,-1.494 ; -11.598,-0.986 -11.37,-0.986
  lines w0.127: -7.874,2.286 -8.255,2.667 ; -7.874,3.048 -8.255,2.667 ; -3.429,6.477 -3.429,2.667 -8.255,2.667 ; 8.255,-5.715 8.255,-6.985 15.113,-6.985 ; 14.732,-7.366 15.113,-6.985 ; 14.732,-6.604 15.113,-6.985
  lines w0.152: -7.112,-4.953 -7.493,-4.572 ; -7.112,-4.191 -7.493,-4.572 ; 3.81,0.635 -1.397,-4.572 -7.493,-4.572 ; 8.001,6.35 10.16,8.509 14.732,8.509 ; 14.351,8.128 14.732,8.509 ; 14.351,8.89 14.732,8.509 ; -30.48,-15.24 -30.48,15.24 30.48,15.24 30.48,-0.182 22.216,-0.182 22.216,-11.358 30.48,-11.358 30.48,-15.24 -30.48,-15.24 ; -30.48,-15.24 -30.48,-15.24 ; -30.125,3.647 -29.058,2.91 -29.058,-6.869 -16.688,-6.869 -16.688,-6.412 -16.688,5.069 -16.688,5.704 -17.323,5.704 -17.323,6.847 -17.704,6.847 -30.125,6.847 -30.125,3.647
  text "SD卡座以及阻容对应 / 区域需要挖空" at -8.255,7.239 h2.03
  text "排针对应的区域 / 需要挖空" at 4.572,-4.953 h2.03
  text "Keep-Out 画的框 / 为建议挖空区域" at 0.889,1.524 h2.03
Keep-Out Layer:
  lines w0.152: -31.496,-10.033 -31.496,10.033 -9.398,10.033 -9.398,-10.033 -31.496,-10.033
  lines w0.203: 16.51,-11.43 16.51,11.557 32.258,11.557 32.258,-11.43 16.51,-11.43
Mechanical 3:
  lines w0.152: 33.598,6.858 34.11,7.37 ; 33.782,-9.144 33.294,-8.656 33.294,-8.616 ; 33.782,-8.128 33.294,-8.616 ; 34.11,6.354 33.606,6.858 39.243,6.858 ; 41.963,-6.608 39.955,-8.616 33.274,-8.616 33.294,-8.616
  text "1. 使用半孔贴装焊接时，底部元器件对应的区域需要挖空 /  / 2. KeepOut 所画的框为建议挖空区域 /  / 3. 当需要使用SD卡以及2*4P下载口时，用户要根据实际情况，将对应的槽扩大以便拔插" at -31.242,-33.742 h2.03
  text "因为该USB端子的固定引脚是直插的， / 在焊接的时候，可能会因为锡渗入底部 / 而造成底部不平整，所以建议挖空" at 39.677,4.949 h2.03
  text "此处的外形线不能贴着核心板的边线， / 因为PCB铣刀无法加工出内直角，实 / 际得到的是内圆角，加上排针临近核 / 心板的边缘，为避免干涉，需要当拉宽" at 34.089,-5.084 h2.03
  text "该KeepOut框仅仅作为示意图，并不代表实际就能开槽!!!!!! / 用户需要根据PCB厂建议的开槽方法去重新绘制外形线!!!!!!" at -30.353,17.629 h3.05
3D body "FK750M3-VBT6-V1.0.step": height 3.86, standoff -2.64, extent -30.48,-15.24 30.48,15.24

## FK750M3-VBT6直插 [mm]
pads (48):
  round 1.5 hole 0.9: 1(29.21,13.97) 2(26.67,13.97) 3(24.13,13.97) 4(21.59,13.97) 5(19.05,13.97) 6(16.51,13.97) 7(13.97,13.97) 8(11.43,13.97) 9(8.89,13.97) 10(6.35,13.97) 11(3.81,13.97) 12(1.27,13.97) 13(-1.27,13.97) 14(-3.81,13.97) 15(-6.35,13.97) 16(-8.89,13.97) 17(-11.43,13.97) 18(-13.97,13.97) 19(-16.51,13.97) 20(-19.05,13.97) 21(-21.59,13.97) 22(-24.13,13.97) 23(-26.67,13.97) 24(-29.21,13.97) 25(29.21,-13.97) 26(26.67,-13.97) 27(24.13,-13.97) 28(21.59,-13.97) 29(19.05,-13.97) 30(16.51,-13.97) 31(13.97,-13.97) 32(11.43,-13.97) 33(8.89,-13.97) 34(6.35,-13.97) 35(3.81,-13.97) 36(1.27,-13.97) 37(-1.27,-13.97) 38(-3.81,-13.97) 39(-6.35,-13.97) 40(-8.89,-13.97) 41(-11.43,-13.97) 42(-13.97,-13.97) 43(-16.51,-13.97) 44(-19.05,-13.97) 45(-21.59,-13.97) 46(-24.13,-13.97) 47(-26.67,-13.97) 48(-29.21,-13.97)
Top Overlay:
  lines w0.152: -30.48,-15.24 30.48,-15.24 30.48,-11.358 22.216,-11.358 22.216,-0.182 30.48,-0.182 30.48,15.24 -30.48,15.24 -30.48,-15.24 ; -30.48,-15.24 -30.48,-15.24
  text "FK750M3" at 25.2,0.2 h1.52
3D body "FK750M3-VBT6-V1.0排针.step": height 14.36, standoff 0.26, extent -30.48,-15.24 30.48,15.24

## GY26 [mm] "GY26电子罗盘模块"
pads (12):
  rect 1.7x1.7 hole 0.9: 1(0,0) 12(0,20.5)
  round 1.7 hole 0.9: 2(2.54,0) 3(5.08,0) 4(7.62,0) 5(10.16,0) 6(12.7,0) 7(12.7,20.5) 8(10.16,20.5) 9(7.62,20.5) 10(5.08,20.5) 11(2.54,20.5)
Top Overlay:
  lines w0.2: -1.27,-1.27 -1.27,1.27 13.97,1.27 13.97,-1.27 -1.27,-1.27 ; -1.27,19.23 13.97,19.23 13.97,21.77 -1.27,21.77 -1.27,19.23
  lines w0.254: 2.2,5.5 10.3,5.5 ; 9.55,4.75 10.3,5.5 ; 9.6,6.2 10.3,5.5 ; -6.4,-2.5 19.1,-2.5 19.1,23 -6.4,23 -6.4,-2.5
  text "TX" at 3.083,1.6 h1.52
  text "RX" at 5.562,1.6 h1.52
  text "SCL" at 8.077,1.6 h1.52
  text "GND" at 13.368,16.066 h1.52
  text "NC" at 5.628,17.14 h1.52
  text "GND" at 10.788,16.066 h1.52
  text "NC" at 3.048,17.14 h1.52
  text "CAL" at 8.208,16.414 h1.52
  text "VCC" at 0.468,16.132 h1.52
  text "SDA" at 10.59,1.6 h1.52
  text "GND" at 13.104,1.6 h1.52
  text "VCC" at 0.604,1.601 h1.52
3D body "HDR2.54-1P_M.STEP": height 8.5, standoff -3, extent 8.89,-1.27 11.43,1.27
3D body "HDR2.54-1P_M.STEP": height 8.5, standoff -3, extent 6.35,-1.27 8.89,1.27
3D body "HDR2.54-1P_M.STEP": height 8.5, standoff -3, extent 11.43,-1.27 13.97,1.27
3D body "HDR2.54-1P_M.STEP": height 8.5, standoff -3, extent 1.27,-1.27 3.81,1.27
3D body "HDR2.54-1P_M.STEP": height 8.5, standoff -3, extent -1.27,-1.27 1.27,1.27
3D body "HDR2.54-1P_M.STEP": height 8.5, standoff -3, extent 3.81,-1.27 6.35,1.27
3D body "HDR2.54-1P_M.STEP": height 8.5, standoff -3, extent -1.27,19.23 1.27,21.77
3D body "HDR2.54-1P_M.STEP": height 8.5, standoff -3, extent 8.89,19.23 11.43,21.77
3D body "HDR2.54-1P_M.STEP": height 8.5, standoff -3, extent 6.35,19.23 8.89,21.77
3D body "HDR2.54-1P_M.STEP": height 8.5, standoff -3, extent 11.43,19.23 13.97,21.77
3D body "HDR2.54-1P_M.STEP": height 8.5, standoff -3, extent 1.27,19.23 3.81,21.77
3D body "HDR2.54-1P_M.STEP": height 8.5, standoff -3, extent 3.81,19.23 6.35,21.77